# Altium footprint library LukaLIBRARY.PcbLib: 772 footprints (part 28 of 49)
Each footprint in its own frame and in the unit in brackets; x right, y up, seen from the top. Pads: shape width x height; smd on the part's side, far side on the other; paste and mask are expansions set on the pad; w line width, h text height; cw(c..) or ccw(c..) is an arc to the next point about the centre after c.
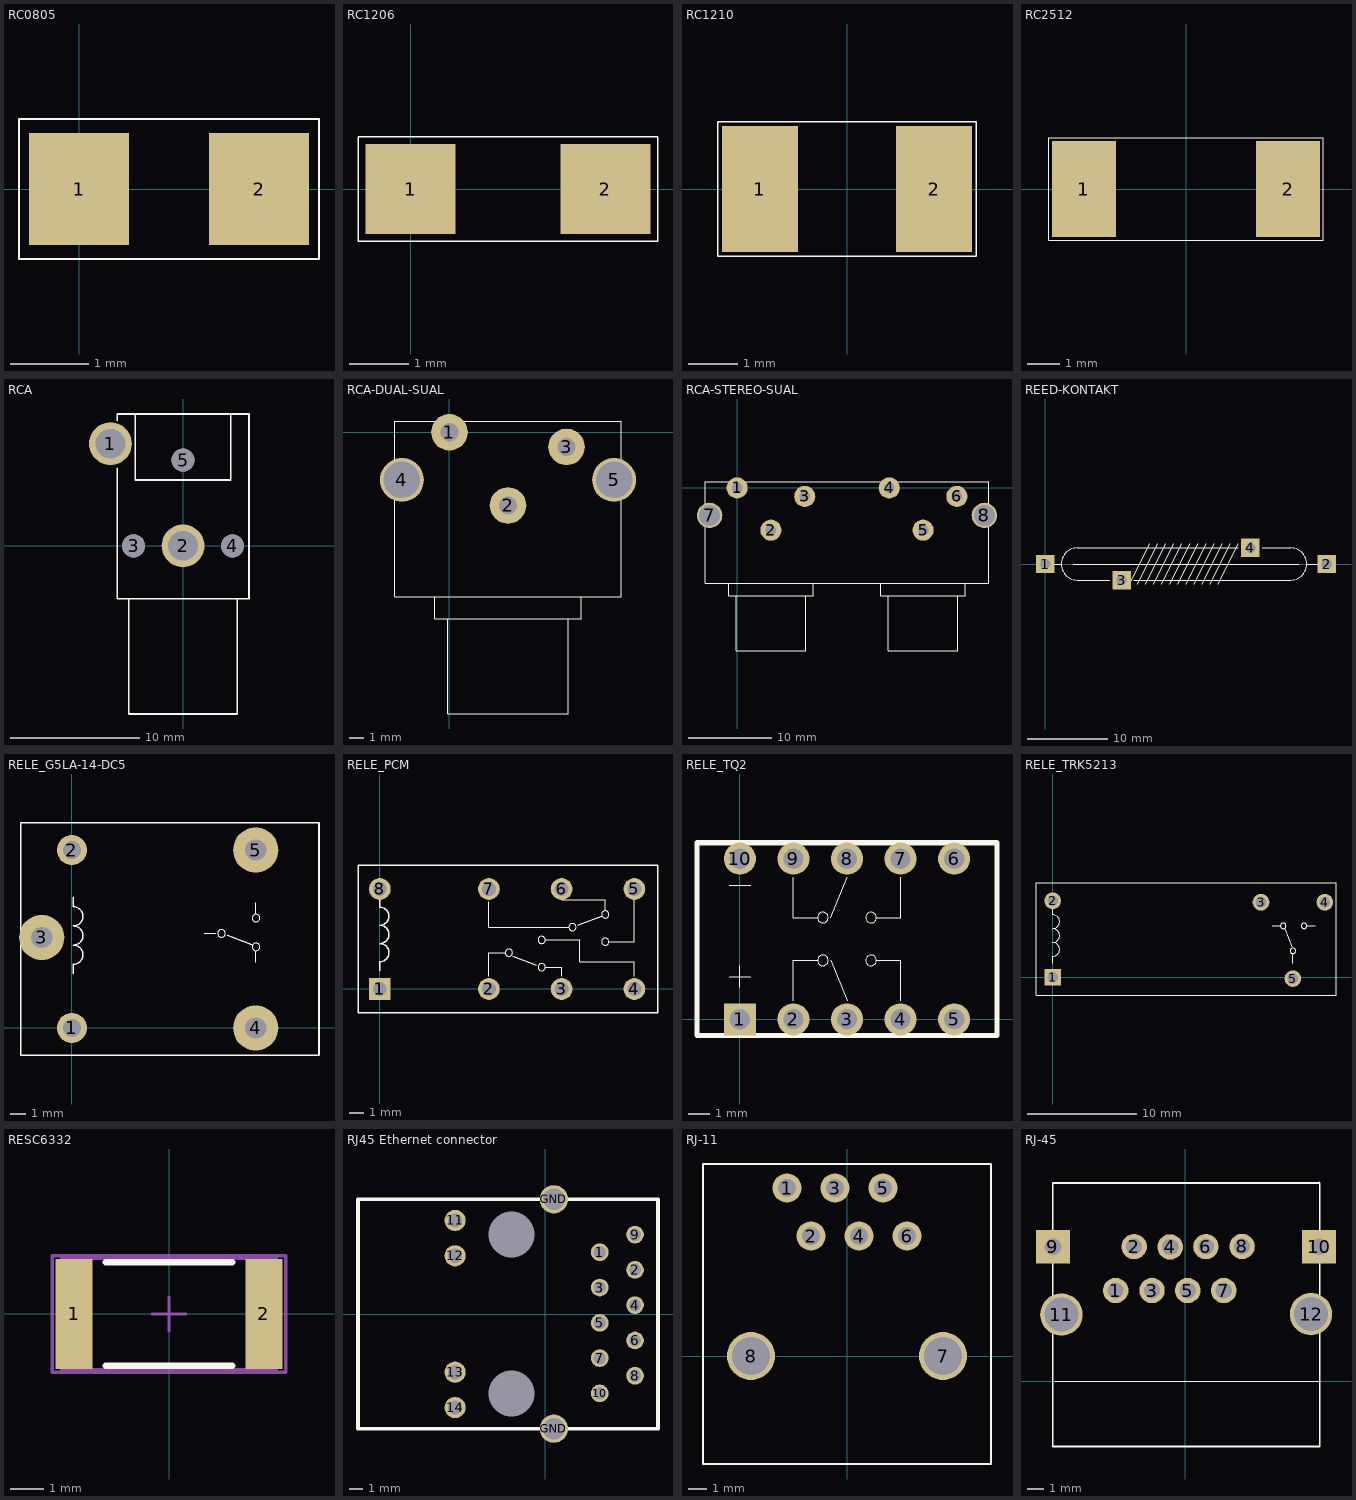
[diagram p27: the footprints below, top view; thin cyan lines are the x and y axes]

## RC0805 [mil]
pads (2):
  rect 50x56 smd mask-1000: 1(0,0) 2(90,0)
Top Overlay:
  lines w1: -30,-35 -30,35 120,35 120,-35 -30,-35
Top Solder:
  region: 65,-28 115,-28 115,28 65,28
  region: -25,-28 25,-28 25,28 -25,28

## RC1206 [mil]
pads (2):
  rect 60x60 smd mask-1000: 1(0,0) 2(130,0)
Top Overlay:
  lines w1: -35,-35 -35,35 165,35 165,-35 -35,-35
Top Solder:
  region: -30,-30 30,-30 30,30 -30,30
  region: 100,-30 160,-30 160,30 100,30

## RC1210 [mm]
pads (2):
  rect 1.524x2.524 smd mask-25.4: 1(-1.75,0) 2(1.75,0)
Top Overlay:
  lines w0.025: -2.6,-1.35 -2.6,1.35 2.6,1.35 2.6,-1.35 -2.6,-1.35
Top Solder:
  region: -0.988,-1.262 -0.988,1.262 -2.512,1.262 -2.512,-1.262
  region: 2.512,-1.262 2.512,1.262 0.988,1.262 0.988,-1.262

## RC2512 [mm]
pads (2):
  rect 2x3 smd mask-25.4: 1(-3.2,0) 2(3.2,0)
Top Overlay:
  lines w0.025: -4.3,-1.6 -4.3,1.6 4.3,1.6 4.3,-1.6 -4.3,-1.6
Top Solder:
  region: -2.2,-1.5 -2.2,1.5 -4.2,1.5 -4.2,-1.5
  region: 4.2,-1.5 4.2,1.5 2.2,1.5 2.2,-1.5

## RCA [mil]
pads (5):
  round 130 hole 90: 1(-220,310) 2(0,0)
  round 70 hole 70: 3(-150,0) 4(150,0) 5(0,260)
Top Overlay:
  lines w5: -200,235 -200,-160 200,-160 200,400 -200,400 -200,380 ; -165,-160 -165,-510 165,-510 165,-160 ; -145,400 -145,200 145,200 145,400

## RCA-DUAL-SUAL [mil]
pads (5):
  round 100 hole 50: 1(0,0) 2(160,-200) 3(320,-40)
  round 120 hole 100: 4(-130,-130) 5(450,-130)
Top Overlay:
  lines w1: -40,-450 -40,-510 360,-510 360,-450 ; -5,-510 -5,-770 325,-770 325,-510 ; -150,-450 -150,30 470,30 470,-450 -150,-450

## RCA-STEREO-SUAL [mil]
pads (8):
  round 100 hole 50: 1(0,0) 2(160,-200) 3(320,-40) 4(720,0) 5(880,-200) 6(1040,-40)
  round 120 hole 100: 7(-130,-130) 8(1170,-130)
Top Overlay:
  lines w1: -40,-450 -40,-510 360,-510 360,-450 ; -5,-510 -5,-770 325,-770 325,-510 ; 680,-450 680,-510 1080,-510 1080,-450 ; 715,-510 715,-770 1045,-770 1045,-510 ; -150,-450 -150,30 1190,30 1190,-450 -150,-450

## REED-KONTAKT [mil]
pads (4):
  rect 90x90 hole 50 mask-1000: 1(0,0) 2(1377.95,0) 3(374.02,-78.74) 4(1003.94,78.74)
Top Overlay:
  lines w3.94: 19.68,0 78.74,0 ; 137.8,0 1240.16,0 ; 314.96,-78.74 157.48,-78.74 cw(c157.48,0) 157.48,78.74 944.88,78.74 ; 413.39,-98.43 511.81,98.43 ; 433.07,-78.74 1200.79,-78.74 ccw(c1200.79,0) 1200.79,78.74 1062.99,78.74 ; 452.76,-98.43 551.18,98.43 ; 492.13,-98.43 590.55,98.43 ; 531.5,-98.43 629.92,98.43 ; 570.87,-98.43 669.29,98.43 ; 610.24,-98.43 708.66,98.43 ; 649.61,-98.43 748.03,98.43 ; 688.98,-98.43 787.4,98.43 ; 728.35,-98.43 826.77,98.43 ; 767.72,-98.43 866.14,98.43 ; 807.09,-98.43 905.51,98.43 ; 846.46,-98.43 944.88,98.43 ; 1279.53,0 1338.58,0
Top Solder:
  region: -45,-45 45,-45 45,45 -45,45
  region: 1332.95,-45 1422.95,-45 1422.95,45 1332.95,45
  region: 329.02,-123.74 419.02,-123.74 419.02,-33.74 329.02,-33.74
  region: 958.94,33.74 1048.94,33.74 1048.94,123.74 958.94,123.74
Bottom Solder:
  region: -45,-45 45,-45 45,45 -45,45
  region: 1332.95,-45 1422.95,-45 1422.95,45 1332.95,45
  region: 329.02,-123.74 419.02,-123.74 419.02,-33.74 329.02,-33.74
  region: 958.94,33.74 1048.94,33.74 1048.94,123.74 958.94,123.74

## RELE_G5LA-14-DC5 [mm]
pads (5):
  round 2 hole 1.2 mask-25.4: 1(0,0) 2(0,11.8)
  round 3 hole 1.4 mask-25.4: 3(-2,6) 4(12.2,0) 5(12.2,11.8)
Top Overlay:
  circle w0.025: c12.219,5.382 r0.254
  circle w0.025: c9.933,6.271 r0.254
  circle w0.025: c12.219,7.287 r0.254
  lines w0.025: 8.79,6.271 9.552,6.271 ; 12.219,4.366 12.219,5.128 ; 12.219,7.541 12.219,8.303
  lines w0.1: -2.4,-1.8 0,-1.8 ; 0.1,3.59 0.1,4.225 ccw(c0.1,4.86) 0.1,5.495 ccw(c0.1,6.13) 0.1,6.765 ccw(c0.1,7.4) 0.1,8.035 0.1,8.67 ; 2,-1.8 -3.4,-1.8 ; 10.314,6.144 11.965,5.509 ; -3.4,-1.8 -3.4,11.8 -3.4,13.6 16.4,13.6 16.4,-1.8 -3.4,-1.8
Top Solder:
  drawing of 5 lines, arcs and shapes, not listed
Bottom Solder:
  drawing of 5 lines, arcs and shapes, not listed

## RELE_PCM [mil]
pads (8):
  rect 60x60 hole 38: 1(0,0)
  round 60 hole 38: 2(300,0) 3(500,0) 4(700,0) 5(700,275) 6(500,275) 7(300,275) 8(0,275)
Top Overlay:
  circle w1: c620,205 r10
  circle w1: c530,170 r10
  circle w1: c620,130 r10
  circle w1: c355,100 r10
  circle w1: c445,135 r10
  circle w1: c445,60 r10
  lines w1: 300,35 300,100 345,100 ; 300,240 300,170 520,170 ; 455,60 500,60 500,35 ; 455,135 550,135 550,75 700,75 700,35 ; 500,245 620,245 620,215 ; 630,130 700,130 700,245
  lines w3.94: 0,50 0,75 ccw(c0,100) 0,125 ccw(c0,150) 0,175 ccw(c0,200) 0,225 0,250 ; 365,90 430,65 ; 545,175 610,200 ; -60,-65 765,-65 765,340 -60,340 -60,-65

## RELE_TQ2 [mil]
pads (10):
  rect 60x60 hole 38: 1(0,0)
  round 60 hole 38: 2(100,0) 3(200,0) 4(300,0) 5(400,0) 6(400,300) 7(300,300) 8(200,300) 9(100,300) 10(0,300)
Top Overlay:
  circle w1: c155,190 r10
  circle w1: c245,190 r10
  circle w1: c155,110 r10
  circle w1: c245,110 r10
  lines w1: -20,80 20,80 ; -20,250 20,250 ; 0,60 0,100 ; 100,35 100,110 145,110 ; 100,265 100,190 145,190 ; 170,110 200,35 ; 170,190 200,265 ; 255,110 300,110 300,35 ; 255,190 300,190 300,265
  lines w10: -80,-30 -80,330 480,330 480,-30 -80,-30

## RELE_TRK5213 [mil]
pads (5):
  rect 60x60 hole 38: 1(0,0)
  round 60 hole 38: 2(0,275) 3(750,270) 4(980,270) 5(865,-5)
Top Overlay:
  circle w1: c905,185 r10
  circle w1: c865,95 r10
  circle w1: c830,185 r10
  lines w1: 790,185 820,185 ; 865,50 865,80 ; 915,185 945,185
  lines w3.94: 0,50 0,75 ccw(c0,100) 0,125 ccw(c0,150) 0,175 ccw(c0,200) 0,225 0,250 ; 835,175 860,110 ; -60,-65 1020,-65 1020,340 -60,340 -60,-65

## RESC6332 [mm] "Chip Resistor, Body 6.3x3.2mm, IPC High Density"
height 0.9
pads (2):
  rect 1.1x3.3 smd: 1(-2.85,0) 2(2.85,0)
Top Overlay:
  lines w0.2: -1.9,-1.55 1.9,-1.55 ; -1.9,1.55 1.9,1.55
Mechanical 13:
  lines w0.1: -3.225,-1.675 3.225,-1.675 3.225,1.675 -3.225,1.675 -3.225,-1.675
Mechanical 15:
  lines w0.1: -0.5,0 0.5,0 ; 0,-0.5 0,0.5 ; -3.5,-1.75 3.5,-1.75 3.5,1.75 -3.5,1.75 -3.5,-1.75
3D body: height 0.9, standoff 0, extent -3.225,-1.675 3.225,1.675

## RJ45 Ethernet connector [mil]
pads (18):
  round 50 hole 35: 1(155,175) 2(255,125) 3(155,75) 4(255,25) 5(155,-25) 6(255,-75) 7(155,-125) 8(255,-175) 9(255,225) 10(155,-225)
  round 60 hole 40: 11(-255,265) 12(-255,165) 13(-255,-165) 14(-255,-265)
  round 80 hole 62: GND(25,-325) GND(25,325)
  round 0 hole 130: ""(-95,-225) ""(-95,225)
Top Overlay:
  lines w10: -530,-325 -530,325 320,325 320,-325 -530,-325

## RJ-11 [mil]
pads (8):
  round 60 hole 38 mask-1000: 1(-125,350) 2(-75,250) 3(-25,350) 4(25,250) 5(75,350) 6(125,250)
  round 100 hole 80: 7(200,0) 8(-200,0)
Top Overlay:
  lines w3.94: -300,-225 300,-225 300,400 -300,400 -300,-225
Top Solder:
  drawing of 6 lines, arcs and shapes, not listed
Bottom Solder:
  drawing of 6 lines, arcs and shapes, not listed

## RJ-45 [mil]
pads (12):
  round 60 hole 38 mask-1000: 1(-164.57,214.17) 2(-120.87,317.72) 3(-78.74,214.17) 4(-35.83,316.93) 5(5.51,214.17) 6(48.43,317.72) 7(90.55,214.17) 8(133.86,318.11)
  rect 80x80 hole 40 mask-1000: 9(-312.54,317.44) 10(315.46,317.44)
  round 100 hole 80: 11(-292.54,157.44) 12(296.46,158.44)
Top Overlay:
  lines w0.39: -308.54,0.44 316.46,0.44 ; 315.46,471.44 316.46,-0.56
  lines w3.94: -312.99,-153.94 316.93,-153.94 316.93,468.11 -312.99,468.11 -312.99,-153.94
Top Solder:
  drawing of 10 lines, arcs and shapes, not listed
Bottom Solder:
  drawing of 10 lines, arcs and shapes, not listed